# Altium integrated library OT Library.IntLib: 560 symbols (part 3 of 4) (continued)
## RELAY_ALZ51F12W (continued)
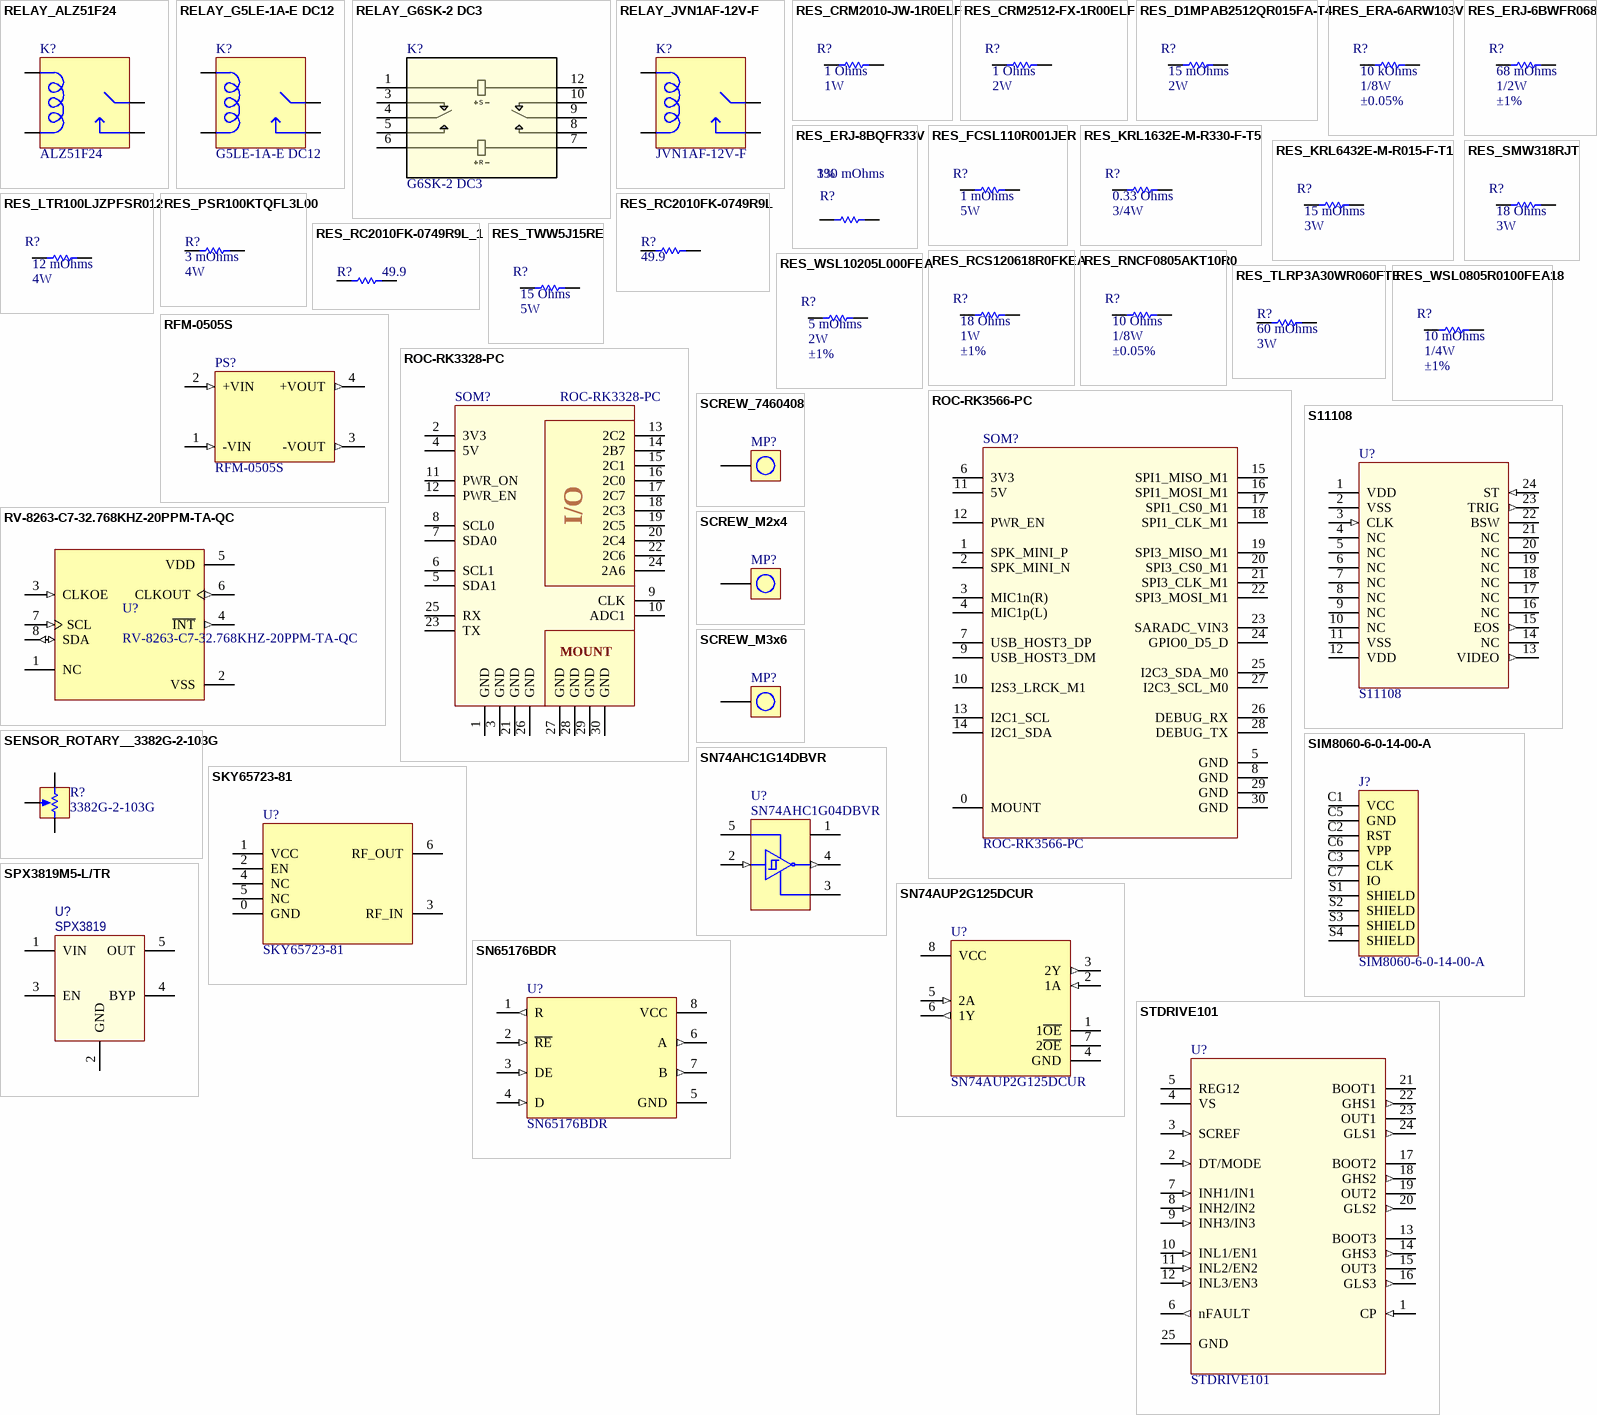
[diagram p16: symbols RELAY_ALZ51F24 to STDRIVE101]

## RELAY_ALZ51F24
designator K?, comment ALZ51F24
RELAY GEN PURPOSE SPST 16A 24V; Manufacturer: Panasonic Electric Works; Coil Voltage: 24VDC; Contact Form: SPST-NO (1 Form A); Switching Voltage: 440VAC - Max; Manufacturer Part Number: ALZ51F24; Contact Rating (Current): 16A
footprint RELAY_ALZ_A
pins: 1 C, 2 NO, 3 C1, 4 C2, 5 NO, 6 C

## RELAY_G5LE-1A-E DC12
designator K?, comment G5LE-1A-E DC12
RELAY GEN PURPOSE SPST 16A 12V; Manufacturer: Omron Electronics Inc-EMC Div; Coil Voltage: 12VDC; Contact Form: SPST-NO (1 Form A); Manufacturer Part Number: G5LE-1A-E DC12; Contact Rating (Current): 16A
footprint Relay_G5LE
pins: 1 COM, 2 C, 3 NO, 5 C

## RELAY_G6SK-2 DC3
designator K?, comment G6SK-2 DC3
RELAY TELECOM DPDT 2A 3V; Manufacturer: Omron Electronics Inc-EMC Div; LCSC Part: C2896754; Manufacturer Part Number: G6SK-2 DC3
footprint RELAY_G6SK-2_OMR
pins: 1, 3, 4, 5, 6, 7, 8, 9, 10, 12
text: S; R

## RELAY_JVN1AF-12V-F
designator K?, comment JVN1AF-12V-F
RELAY GEN PURPOSE SPST 16A 12V; Manufacturer: Panasonic Electric Works; Coil Voltage: 12VDC; Contact Form: SPST-NO (1 Form A); Manufacturer Part Number: JVN1AF-12V-F; Contact Rating (Current): 16A
footprint Relay_JV_N (Footprint not found)
pins: 1 C, 2 C, 3 COM, 4 NO

## RES_CRM2010-JW-1R0ELF
designator R?, comment Power (Watts): 1W  Resistance: 1 Ohms  (hidden comment: CRM2010-JW-1R0ELF)
RES SMD 1 OHM 5% 1W 2010; Manufacturer: Bourns Inc.; Manufacturer Part Number: CRM2010-JW-1R0ELF; Datasheet: https://connect.kemet.com:7667/gateway/IntelliData-ComponentDocumentation/1.0/download/datasheet/R76PD1220SE00K; Tolerance: ±5%; LCSC Part: C161983
footprint RES_2010 (0.197" L x 0.098" W (5.00mm x 2.50mm))
pins: 1, 2

## RES_CRM2512-FX-1R00ELF
designator R?, comment Power (Watts): 2W  Resistance: 1 Ohms  (hidden comment: CRM2512-FX-1R00ELF)
RES SMD 1 OHM 1% 2W 2512; Manufacturer: Bourns Inc.; Manufacturer Part Number: CRM2512-FX-1R00ELF; Tolerance: ±1%
footprint RES_2512 (0.250" L x 0.120" W (6.35mm x 3.05mm))
pins: 1, 2

## RES_D1MPAB2512QR015FA-T4
designator R?, comment Power (Watts): 2W  Resistance: 15 mOhms  (hidden comment: D1MPAB2512QR015FA-T4)
RES 0.015 OHM 1% 2W 2512; Manufacturer: Thin Film Technology Corp.; Manufacturer Part Number: D1MPAB2512QR015FA-T4; Tolerance: ±1%; LCSC Part: C493475
footprint RES_2512 (0.250" L x 0.120" W (6.35mm x 3.05mm))
pins: 1, 2

## RES_ERA-6ARW103V
designator R?, comment Tolerance: ±0.05%  Power (Watts): 1/8W  Resistance: 10 kOhms  (hidden comment: ERA-6ARW103V)
RES SMD 10K OHM 0.05% 1/8W 0805; Manufacturer: Panasonic Electronic Components; Manufacturer Part Number: ERA-6ARW103V
footprint RES_0805
pins: 1, 2

## RES_ERJ-6BWFR068V
designator R?, comment Tolerance: ±1%  Power (Watts): 1/2W  Resistance: 68 mOhms  (hidden comment: ERJ-6BWFR068V)
RES 0.068 OHM 1% 1/2W 0805; Manufacturer: Panasonic Electronic Components; Manufacturer Part Number: ERJ-6BWFR068V
footprint RES_0805
pins: 1, 2

## RES_ERJ-8BQFR33V
designator R?, comment Resistance: 330 mOhms  Tolerance: 1%  (hidden comment: ERJ-8BQFR33V)
RES 0.33 OHM 1% 1/2W 1206; Manufacturer: Panasonic; Temperature Coefficient: 250ppm/°C; Power Rating: 330mW; Max Power Dissipation: 500mW; Supplier 1: Avnet; Manufacturer Part Number: ERJ-8BQFR33V; Stock 1: 0; Pricing 1: 5000=0.0467, 10000=0.0458, 20000=0.0448, 30000=0.0437, 40000=0.0428 (USD); Mount: Surface Mount; Case/Package: 1206; Number of Pins: 2; Contact Plating: Tin; Case Code (Imperial): 1206; Case Code (Metric): 3216; Min Operating Temperature: -55°C; Max Operating Temperature: 125°C; Resistor Type: Thick Film,Low-Ohm-Resistor; Package Quantity: 5000; Packaging: Tape and Reel; Series: ERJ; Termination: SMD/SMT; Number of Terminations: 2; Features: Automotive AEC-Q200; Technology: THICK FILM; Resistance Tolerance: 1%; Length: 3.2mm; Width: 1.6mm; Height: 0.6mm; Depth: 1.6mm; Ratings: AEC-Q200; Radiation Hardening: No; Reach SVHC Compliant: No; RoHS Compliant: Yes; ComponentLink1URL: https://datasheet.ciiva.com/11818/0900766b80eefa12-11818652.pdf?src-supplier=Rs; ComponentLink1Description: https://datasheet.ciiva.com/11818/0900766b80eefa12-11818652.pdf?src-supplier=Rs; ComponentLink2URL: https://datasheet.ciiva.com/48516/erj-eng-tds-48516634.pdf?src-supplier=Distrelec; ComponentLink2Description: https://datasheet.ciiva.com/48516/erj-eng-tds-48516634.pdf?src-supplier=Distrelec; ComponentLink3URL: https://datasheet.ciiva.com/6064/391509-6064714.pdf?src-supplier=Farnell; ComponentLink3Description: https://datasheet.ciiva.com/6064/391509-6064714.pdf?src-supplier=Farnell; ComponentLink4URL: https://datasheet.ciiva.com/7710/391509-7710826.pdf?src-supplier=Element14; ComponentLink4Description: https://datasheet.ciiva.com/7710/391509-7710826.pdf?src-supplier=Element14; ComponentLink5URL: https://datasheet.ciiva.com/6064/391509-6064716.pdf?src-supplier=Farnell; ComponentLink5Description: https://datasheet.ciiva.com/6064/391509-6064716.pdf?src-supplier=Farnell; ComponentLink6URL: https://datasheet.ciiva.com/7710/391509-7710825.pdf?src-supplier=Element14; ComponentLink6Description: https://datasheet.ciiva.com/7710/391509-7710825.pdf?src-supplier=Element14; Supplier Part Number 1: ERJ-8BQFR33V
footprint RES_1206 (Chip Resistor; Body 3.2 x 1.6 mm (LxW typ))
pins: 1, 2

## RES_FCSL110R001JER
designator R?, comment Power (Watts): 5W  Resistance: 1 mOhms  (hidden comment: FCSL110R001JER)
RES 0.001 OHM 5W 4320 WIDE; Manufacturer: Ohmite; Tolerance: ±1%; Manufacturer Part Number: FCSL110R001JER
footprint RES_4320_W (0.197" L x 0.433" W (5.00mm x 11.00mm))
pins: 1, 2

## RES_KRL1632E-M-R330-F-T5
designator R?, comment Power (Watts): 3/4W  Resistance: 0.33 Ohms  (hidden comment: KRL1632E-M-R330-F-T5)
RES 0.33 OHM 1% 3/4W 1206; Manufacturer: Susumu; Manufacturer Part Number: KRL1632E-M-R330-F-T5; Tolerance: ±1%
footprint RES_1206 (Chip Resistor; Body 3.2 x 1.6 mm (LxW typ))
pins: 1, 2

## RES_KRL6432E-M-R015-F-T1
designator R?, comment Power (Watts): 3W  Resistance: 15 mOhms  (hidden comment: KRL6432E-M-R015-F-T1)
RES 0.015 OHM 3W 2512 WIDE; Manufacturer: Susumu; Tolerance: ±1%; Manufacturer Part Number: KRL6432E-M-R015-F-T1; Datasheet: https://www.susumu.co.jp/common/pdf/n_catalog_partition19_en.pdf
footprint RES_2512_W (0.122" L x 0.248" W (3.10mm x 6.30mm))
pins: 1, 2

## RES_LTR100LJZPFSR012
designator R?, comment Power (Watts): 4W  Resistance: 12 mOhms  (hidden comment: LTR100LJZPFSR012)
RES 0.012 OHM 4W 2512 WIDE; Manufacturer: Rohm Semiconductor; Tolerance: ±1%; Manufacturer Part Number: LTR100LJZPFSR012
footprint RES_2512_W (0.122" L x 0.248" W (3.10mm x 6.30mm))
pins: 1, 2

## RES_PSR100KTQFL3L00
designator R?, comment Power (Watts): 4W  Resistance: 3 mOhms  (hidden comment: PSR100KTQFL3L00)
RES 0.003 OHM 1% 3W 2512; Manufacturer: Rohm Semiconductor; Manufacturer Part Number: PSR100KTQFL3L00; Datasheet: https://fscdn.rohm.com/en/products/databook/datasheet/passive/resistor/chip_resistor/psr-e.pdf; Tolerance: ±1%
footprint RES_2512 (0.250" L x 0.120" W (6.35mm x 3.05mm))
pins: 1, 2

## RES_RC2010FK-0749R9L
designator R?, comment Resistance: 49.9  (hidden comment: RC2010FK-0749R9L)
RES 49.9 OHM 1% 3/4W 2010; Manufacturer: YAGEO; Power (Watts): 0.75W, 3/4W; Manufacturer Part Number: RC2010FK-0749R9L; Tolerance: ±1%; LCSC Part: C326716
footprint RES_2010 (0.197" L x 0.098" W (5.00mm x 2.50mm))
pins: 1, 2

## RES_RC2010FK-0749R9L_1
designator R?, comment Resistance: 49.9  (hidden comment: RC2010FK-0749R9L)
RES 49.9 OHM 1% 3/4W 2010; Manufacturer: YAGEO; Power (Watts): 0.75W, 3/4W; Manufacturer Part Number: RC2010FK-0749R9L; Tolerance: ±1%; LCSC Part: C326716
footprint RES_2010 (0.197" L x 0.098" W (5.00mm x 2.50mm))
pins: 1, 2

## RES_RCS120618R0FKEA
designator R?, comment Tolerance: ±1%  Power (Watts): 1W  Resistance: 18 Ohms  (hidden comment: RCS120618R0FKEA)
RES 18 OHM 1% 1W 1206; Manufacturer: Vishay Dale; Manufacturer Part Number: RCS120618R0FKEA
footprint RES_1206 (Chip Resistor; Body 3.2 x 1.6 mm (LxW typ))
pins: 1, 2

## RES_RNCF0805AKT10R0
designator R?, comment Tolerance: ±0.05%  Power (Watts): 1/8W  Resistance: 10 Ohms  (hidden comment: RNCF0805AKT10R0)
RES SMD 10 OHM 0.05% 1/8W 0805; Manufacturer: Stackpole Electronics Inc; Manufacturer Part Number: RNCF0805AKT10R0
footprint RES_0805
pins: 1, 2

## RES_SMW318RJT
designator R?, comment Power (Watts): 3W  Resistance: 18 Ohms  (hidden comment: SMW318RJT)
RES SMD 18 OHM 5% 3W 4122; Manufacturer: TE Connectivity Passive Product; Manufacturer Part Number: SMW318RJT; Tolerance: ±5%
footprint RES_4122 (0.413" L x 0.217" W (10.50mm x 5.50mm))
pins: 1, 2

## RES_TLRP3A30WR060FTE
designator R?, comment Power (Watts): 3W  Resistance: 60 mOhms  (hidden comment: TLRP3A30WR060FTE)
RES 0.06 OHM 1% 3W 2512; Manufacturer: TE Connectivity Passive Product; Manufacturer Part Number: TLRP3A30WR060FTE; Tolerance: ±1%
footprint RES_2512 (0.250" L x 0.120" W (6.35mm x 3.05mm))
pins: 1, 2

## RES_TWW5J15RE
designator R?, comment Power (Watts): 5W  Resistance: 15 Ohms  (hidden comment: TWW5J15RE)
RES 15 OHM 5% 5W RADIAL; Manufacturer: Ohmite; Manufacturer Part Number: TWW5J15RE; Tolerance: ±5%; LCSC Part: C2646509
footprint RES_12.50MM X 9.00MM (0.492" L x 0.354" W (12.50mm x 9.00mm))
pins: 1, 2

## RES_WSL0805R0100FEA18
designator R?, comment Tolerance: ±1%  Power (Watts): 1/4W  Resistance: 10 mOhms  (hidden comment: WSL0805R0100FEA18)
RES 0.01 OHM 1% 1/4W 0805; Manufacturer: Vishay Dale; Manufacturer Part Number: WSL0805R0100FEA18
footprint RES_0805
pins: 1, 2

## RES_WSL10205L000FEA
designator R?, comment Tolerance: ±1%  Power (Watts): 2W  Resistance: 5 mOhms  (hidden comment: WSL10205L000FEA)
RES 0.005 OHM 1% 2W 2010; Manufacturer: Vishay Dale; Manufacturer Part Number: WSL10205L000FEA; Datasheet: https://www.vishay.com/docs/30183/wslwide.pdf
footprint RES_2010_W (0.200" L x 0.100" W (5.08mm x 2.54mm))
pins: 1, 2

## RFM-0505S
designator PS?
DC DC CONVERTER 5V 1W; Manufacturer: Recom Power; Manufacturer Part Number: RFM-0505S; Datasheet: https://recom-power.com/pdf/Econoline/RFM.pdf
footprint RFM-0505S (0.45" L x 0.24" W x 0.39" H (11.5mm x 6.0mm x 10.0mm))
pins: 1 -VIN (in), 2 +VIN (in), 3 -VOUT (out), 4 +VOUT (out)

## ROC-RK3328-PC
designator SOM?
Quad-core 64-bit Mini PC; Manufacturer: Firefly; Manufacturer Part Number: ROC-RK3328-PC; Datasheet: https://download.t-firefly.com/产品规格文档/开源主板/ROC-RK3328-PC_Quad-core%2064-bit%20Mini%20PC_Specification.pdf?v=1688453152
footprint ROC-RK3328-PC
pins: 1 GND, 2 3V3, 3 GND, 4 5V, 5 SDA1, 6 SCL1, 7 SDA0, 8 SCL0, 9 CLK, 10 ADC1, 11 PWR_ON, 12 PWR_EN, 13 2C2, 14 2B7, 15 2C1, 16 2C0, 17 2C7, 18 2C3, 19 2C5, 20 2C4, 21 GND, 22 2C6, 23 TX, 24 2A6, 25 RX, 26 GND, 27 GND, 28 GND, 29 GND, 30 GND
text: I/O; MOUNT

## ROC-RK3566-PC
designator SOM?
Quad-core 64-bit Mini PC; Manufacturer: Firefly; Manufacturer Part Number: ROC-RK3566-PC; Datasheet: https://download.t-firefly.com/%E4%BA%A7%E5%93%81%E8%A7%84%E6%A0%BC%E6%96%87%E6%A1%A3/%E5%BC%80%E6%BA%90%E4%B8%BB%E6%9D%BF/ROC-RK3566-PC%20Specification.pdf
footprint ROC-RK3566-PC
pins: 0 MOUNT, 1 SPK_MINI_P, 2 SPK_MINI_N, 3 MIC1n(R), 4 MIC1p(L), 5 GND, 6 3V3, 7 USB_HOST3_DP, 8 GND, 9 USB_HOST3_DM, 10 I2S3_LRCK_M1, 11 5V, 12 PWR_EN, 13 I2C1_SCL, 14 I2C1_SDA, 15 SPI1_MISO_M1, 16 SPI1_MOSI_M1, 17 SPI1_CS0_M1, 18 SPI1_CLK_M1, 19 SPI3_MISO_M1, 20 SPI3_CS0_M1, 21 SPI3_CLK_M1, 22 SPI3_MOSI_M1, 23 SARADC_VIN3, 24 GPIO0_D5_D, 25 I2C3_SDA_M0, 26 DEBUG_RX, 27 I2C3_SCL_M0, 28 DEBUG_TX, 29 GND, 30 GND

## RV-8263-C7-32.768KHZ-20PPM-TA-QC
designator U?
IC RTC CLK/CALENDAR I2C 8SON; Manufacturer: Micro Crystal; Manufacturer Part Number: RV-8263-C7-32.768KHZ-20PPM-TA-QC
footprint IC_RV-8263-C7-32.768KHZ-20PPM-TA-QC
pins: 1 NC, 2 VSS (power), 3 CLKOE (in), 4 ~{INT} (out), 5 VDD (power), 6 CLKOUT (out), 7 SCL (in), 8 SDA (io)

## S11108
designator U?
Image Sensor, 14µm x 14µm, LCP, 24 Pins, 4.75 V; Manufacturer: Hamamatsu; Manufacturer Part Number: S11108
footprint DIP24_S11108_HAM
pins: 1 VDD (power), 2 VSS (power), 3 CLK (in), 4 NC, 5 NC, 6 NC, 7 NC, 8 NC, 9 NC, 10 NC, 11 VSS (power), 12 VDD (power), 13 VIDEO (out), 14 NC, 15 EOS (out), 16 NC, 17 NC, 18 NC, 19 NC, 20 NC, 21 NC, 22 BSW, 23 TRIG (out), 24 ST (in)

## SCREW_7460408
designator MP?, comment 7460408  (value not drawn)
TERM REDCUBE M5 12PIN PCB; Manufacturer: Würth Elektronik; Manufacturer Part Number: 7460408
footprint 7460408_chemical surface (M5, thr 6mm)
pins: 1

## SCREW_M2x4
designator MP?, comment RM2X8MM 2701  (value not drawn)
MACH SCREW PAN HEAD PHILLIPS M2; Manufacturer: APM Hexseal; Manufacturer Part Number: RM2X8MM 2701
footprint SCREW_M2X4
pins: 1

## SCREW_M3x6
designator MP?, comment RM3X6MM 2701  (value not drawn)
MACH SCREW PAN HEAD PHILLIPS M3; Manufacturer: APM Hexseal; Manufacturer Part Number: RM3X6MM 2701
footprint SCREW_M3X6
pins: 1

## SENSOR_ROTARY__3382G-2-103G
designator R?, comment 3382G-2-103G
SENSOR ROTARY 330DEG SMD; Manufacturer: Bourns; Manufacturer Part Number: 3382G-2-103G; LCSC Part: C2153636
footprint SENSOR_ROTARY__3382G-2
pins: 1 TOP, 2 TAP, 3 BOT

## SIM8060-6-0-14-00-A
designator J?
SIM NANO HINGED, 6P, 1.40MM PROF; Manufacturer: GCT; Manufacturer Part Number: SIM8060-6-0-14-00-A
footprint GCT_SIM8060-6-0-14-00-A
pins: C1 VCC, C2 RST, C3 CLK, C5 GND, C6 VPP, C7 IO, S1 SHIELD, S2 SHIELD, S3 SHIELD, S4 SHIELD

## SKY65723-81
designator U?
IC AMP BDS 1.559-1.606GHZ 6MCM; Manufacturer: Skyworks Solutions Inc.; Manufacturer Part Number: SKY65723-81; LCSC Part: C2654196
footprint 6-DFN Exposed Pad (6-MCM (1.7x2.3))
pins: 0 GND, 1 VCC, 2 EN, 3 RF_IN, 4 NC, 5 NC, 6 RF_OUT

## SN74AHC1G14DBVR
designator U?, comment SN74AHC1G04DBVR
IC INVERTER 1CH 1-INP SOT23-5; Manufacturer: Texas Instruments; Manufacturer Part Number: SN74AHC1G04DBVR; LCSC Part: C7465
footprint SOT-23-5 (SC-74A, SOT-753)
pins: 1 NC, 2 A (in), 3 GND (power), 4 Y (out), 5 VCC (power)

## SN74AUP2G125DCUR
designator U?
IC BUFFER NON-INVERT 3.6V 8VSSOP; Manufacturer: Texas Instruments; Manufacturer Part Number: SN74AUP2G125DCUR; LCSC Part: C2862074
footprint 8-VSSOP (8-VFSOP (0.091", 2.30mm Width))
pins: 1 1~{OE} (power), 2 1A (in), 3 2Y (out), 4 GND (power), 5 2A (in), 6 1Y (out), 7 2~{OE} (power), 8 VCC (power)

## SN65176BDR
designator U?
IC TRANSCEIVER HALF 1/1 8SOIC; Manufacturer: Texas Instruments; Manufacturer Part Number: SN65176BDR
footprint SOIC-8 (0.154", 3.90mm Width)
pins: 1 R (out), 2 ~{RE} (in), 3 DE (in), 4 D (in), 5 GND (power), 6 A (out), 7 B (out), 8 VCC (power)

## SPX3819M5-L/TR
designator U?, comment SPX3819
IC REG LIN POS ADJ 500MA SOT23-5; Manufacturer Part Number: SPX3819M5-L/TR; Manufacturer: MaxLinear, Inc.; LCSC Part: C9056
footprint SOT-23-5 (SC-74A, SOT-753)
pins: 1 VIN, 2 GND, 3 EN, 4 BYP, 5 OUT

## STDRIVE101
designator U?
IC HALF BRIDGE DRIVER 24VFQFPN; Manufacturer: STMicroelectronics; Manufacturer Part Number: STDRIVE101; LCSC Part: C2969847
footprint 24-VFQFN Exposed Pad (24-QFN (4x4))
pins: 1 CP (in), 2 DT/MODE (in), 3 SCREF (in), 4 VS (power), 5 REG12 (power), 6 nFAULT (out), 7 INH1/IN1 (in), 8 INH2/IN2 (in), 9 INH3/IN3 (in), 10 INL1/EN1 (in), 11 INL2/EN2 (in), 12 INL3/EN3 (in), 13 BOOT3 (power), 14 GHS3 (out), 15 OUT3 (power), 16 GLS3 (out), 17 BOOT2 (power), 18 GHS2 (out), 19 OUT2 (power), 20 GLS2 (out), 21 BOOT1 (power), 22 GHS1 (out), 23 OUT1 (power), 24 GLS1 (out), 25 GND (power)

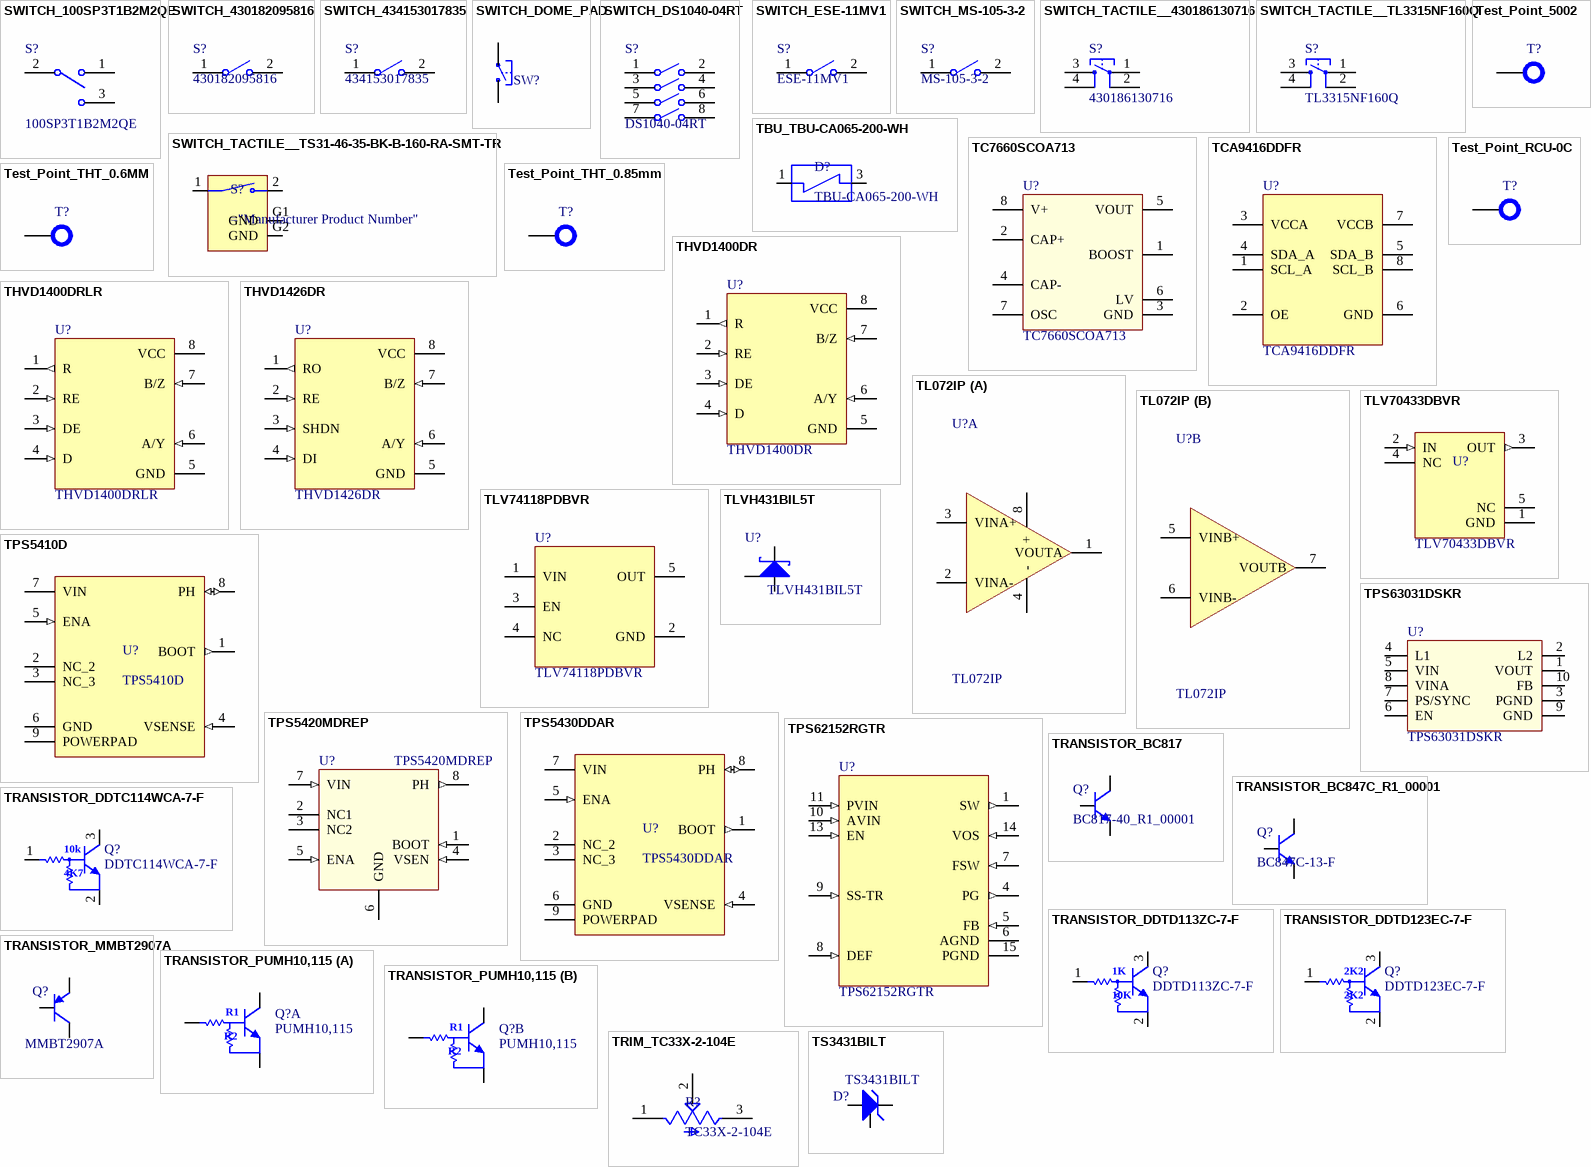
[diagram p17: symbols SWITCH_100SP3T1B2M2QE to TS3431BILT]

## SWITCH_100SP3T1B2M2QE
designator S?, comment 100SP3T1B2M2QE
SWITCH TOGGLE SPDT 5A 120V; Manufacturer: E-Switch; Manufacturer Part Number: 100SP3T1B2M2QE
footprint SWITCH_100SP3T1B2M2QE
pins: 1, 2, 3

## SWITCH_430182095816
designator S?, comment 430182095816
SWITCH TACTILE SPST-NO 0.05A 12V; Manufacturer: Würth Elektronik; Manufacturer Part Number: 430182095816; LCSC Part: C7185035
footprint WS-TASV_L6W6H9.5_4301x20958x6 (SMD Tact Switch, body 6x6mm)
pins: 1, 2, 3, 4

## SWITCH_434153017835
designator S?, comment 434153017835
SWITCH TACTILE SPST-NO 0.05A 12V; Manufacturer: Würth Elektronik; Manufacturer Part Number: 434153017835; Datasheet: https://www.we-online.com/katalog/datasheet/434153017835.pdf
footprint WS-TASV_L3.5W2.9H1.7_434153017835 (Tact Switch, SMD, body 3.5x2.9mm)
pins: 1, 2, 3, 4

## SWITCH_DOME_PAD
designator SW?  (value not drawn)  (no BOM)
Dome switch pad
footprint SWITCH_DOME_PAD__4X3
pins: 1, 2

## SWITCH_DS1040-04RT
designator S?, comment DS1040-04RT
SWITCH SLIDE DIP SPST 100MA 24V; Manufacturer: CONNFLY; Manufacturer Part Number: DS1040-04RT
footprint SWITCH_DS1040-04RT
pins: 1, 2, 3, 4, 5, 6, 7, 8

## SWITCH_ESE-11MV1
designator S?, comment ESE-11MV1
SWITCH DETECTOR SPST-NO 0.01A 5V; Manufacturer: Panasonic Electronic Components; Manufacturer Part Number: ESE-11MV1
footprint ESE-11MV1
pins: 1, 2

## SWITCH_MS-105-3-2
designator S?, comment MS-105-3-2
MINIATURE REED SENSOR PITCH 12.7; Manufacturer: PIC GmbH; Manufacturer Part Number: MS-105-3-2
footprint MS-105-3-2 (Footprint not found)
pins: 1, 2

## SWITCH_TACTILE__430186130716
designator S?, comment 430186130716
SWITCH TACTILE SPST-NO 0.05A 12V; Manufacturer: Würth Elektronik; Manufacturer Part Number: 430186130716
footprint Tact_THD_430186130716 (6x6mm Tact Switch, THT version)
pins: 1, 2, 3, 4